# Altium footprint library mobinbyn-Module.PcbLib: 93 footprints (part 6 of 6)
Each footprint in its own frame and in the unit in brackets; x right, y up, seen from the top. Pads: shape width x height; smd on the part's side, far side on the other; paste and mask are expansions set on the pad; w line width, h text height; cw(c..) or ccw(c..) is an arc to the next point about the centre after c.
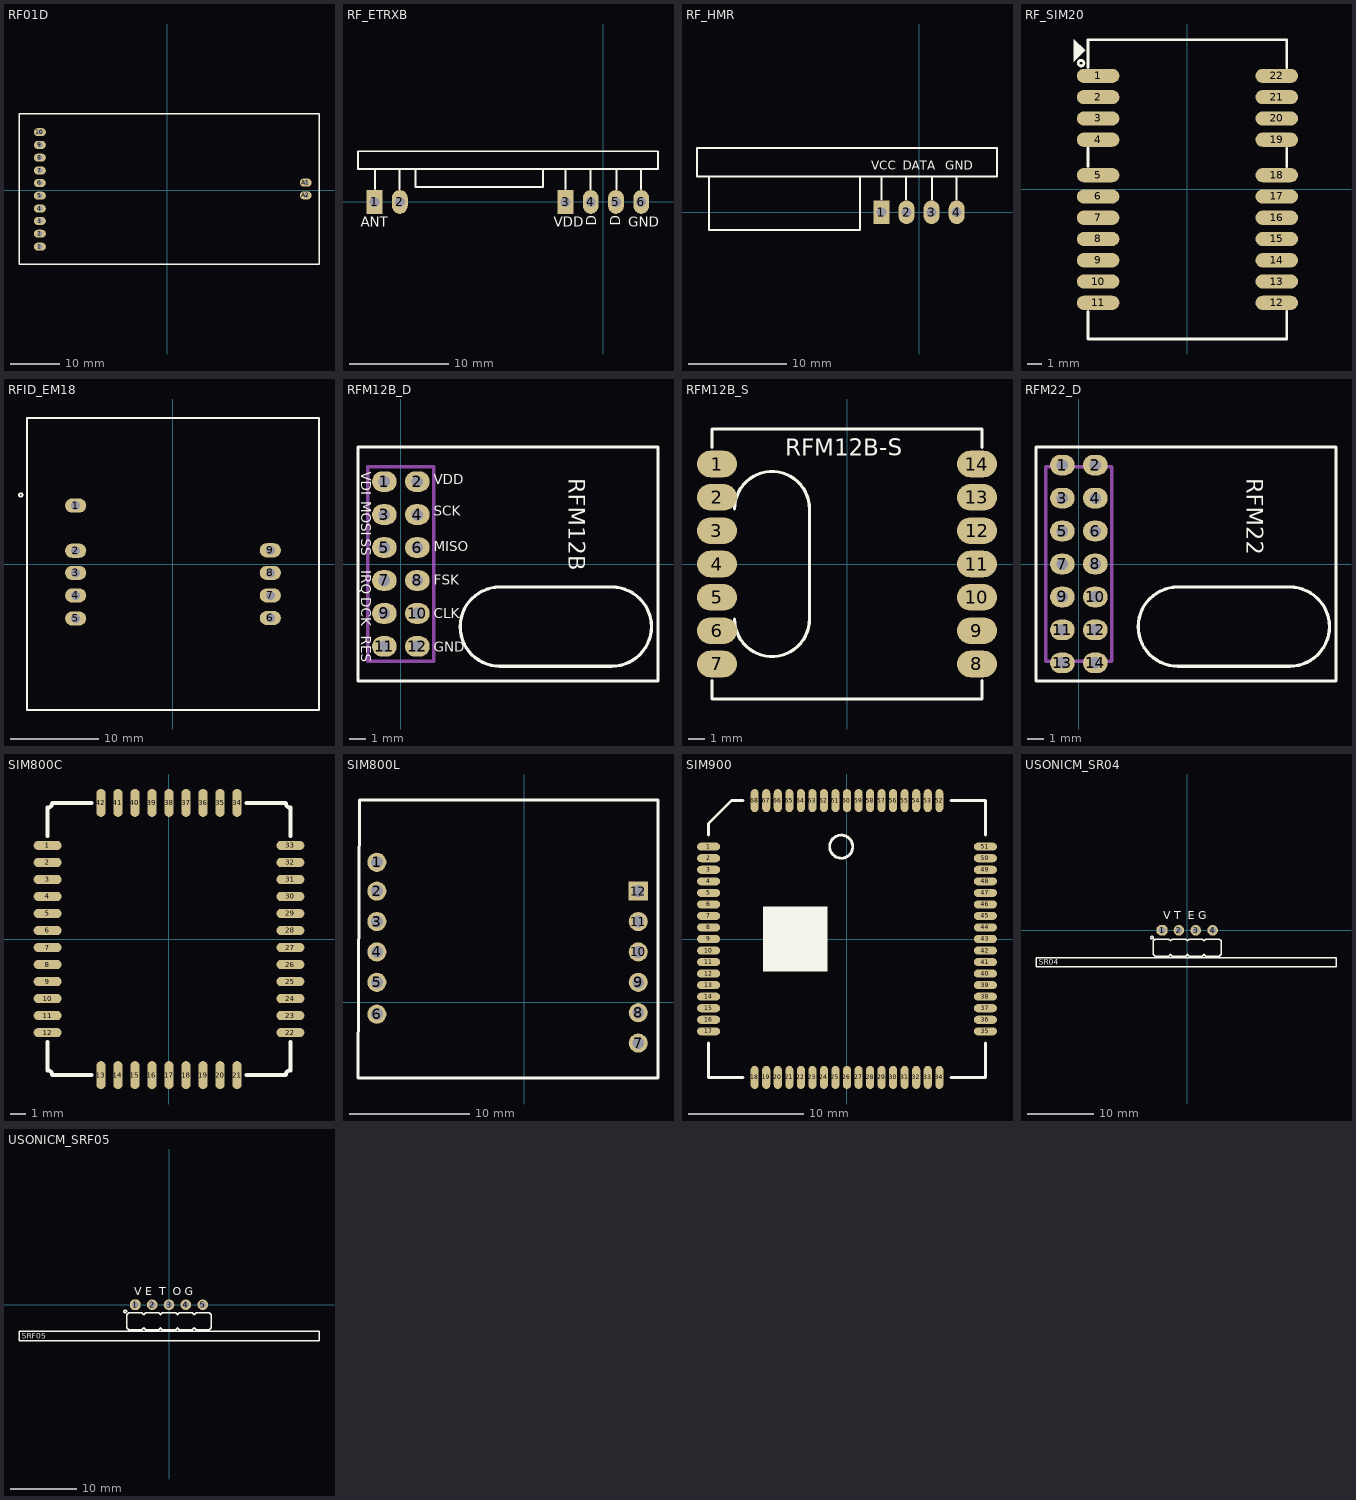
[diagram p5: the footprints below, top view; thin cyan lines are the x and y axes]

## RF01D [mm] "RF01D"
pads (12):
  oval 2.4x1.6 hole 1: 1(-25.654,-11.337) 2(-25.654,-8.737) 3(-25.654,-6.187) 4(-25.654,-3.687) 5(-25.654,-1.087) 6(-25.654,1.463) 7(-25.654,3.963) 8(-25.654,6.563) 9(-25.654,9.113) 10(-25.654,11.684) A1(27.813,1.524) A2(27.813,-1.016)
Top Overlay:
  lines w0.254: -29.845,-14.859 30.48,-14.859 30.48,15.367 -29.845,15.367 -29.845,-14.859
3D body "User Library-RF01D-1.STEP": height 12.1, standoff -9, extent -29.647,-14.746 30.353,15.254

## RF_ETRXB [mm] "Module RF, Receiver, ET-RXB-12, ET-RXB-22"
pads (6):
  rect 1.6x2.4 hole 1: 1(-23.03,0) 3(-3.81,0)
  oval 1.6x2.4 hole 1: 2(-20.49,0) 4(-1.27,0) 5(1.27,0) 6(3.81,0)
Top Overlay:
  lines w0.2: -23,1.3 -23,3.3 ; -20.5,1.3 -20.5,3.3 ; -18.9,3.3 -18.9,1.5 -6.1,1.5 -6.1,3.3 ; -3.8,1.3 -3.8,3.3 ; -1.3,1.3 -1.3,3.3 ; 1.3,1.3 1.3,3.3 ; 3.8,1.3 3.8,3.3 ; -24.7,3.3 5.5,3.3 5.5,5.1 -24.7,5.1 -24.7,3.3
  text "ANT" at -24.4,-2.5 h1
  text "GND" at 2.5,-2.5 h1
  text "D" at 1.7,-2.4 h1
  text "D" at -0.7,-2.4 h1
  text "VDD" at -5,-2.5 h1
3D body "RF_ETRXB.step": height 8.5, standoff -6.05, extent -24.6,-0.25 5.4,8.2

## RF_HMR [mm] "Module RF, Receiver, HM-R"
pads (4):
  rect 1.6x2.4 hole 1: 1(-3.81,0)
  oval 1.6x2.4 hole 1: 2(-1.27,0) 3(1.27,0) 4(3.81,0)
Top Overlay:
  lines w0.2: -21.3,3.6 -21.3,-1.8 -6,-1.8 -6,3.6 ; -3.8,1.3 -3.8,3.6 ; -1.3,1.3 -1.3,3.6 ; 1.3,1.3 1.3,3.6 ; 3.8,1.3 3.8,3.6 ; -22.5,3.6 -22.5,6.5 7.9,6.5 7.9,3.6 -22.5,3.6
  text "DATA" at -1.651,4.318 h0.89
  text "GND" at 2.667,4.318 h0.89
  text "VCC" at -4.826,4.318 h0.89
3D body "User Library-XD-RF-5V.STEP": height 14.75, standoff -4.25, extent -22.3,-1.7 7.7,6.3

## RF_SIM20 [mm] "RF MODULE, SIMCOM SIM20"
pads (22):
  oval 3x1 smd: 1(-6.3,8) 2(-6.3,6.5) 3(-6.3,5) 4(-6.3,3.5) 5(-6.3,1) 6(-6.3,-0.5) 7(-6.3,-2) 8(-6.3,-3.5) 9(-6.3,-5) 10(-6.3,-6.5) 11(-6.3,-8) 12(6.3,-8) 13(6.3,-6.5) 14(6.3,-5) 15(6.3,-3.5) 16(6.3,-2) 17(6.3,-0.5) 18(6.3,1) 19(6.3,3.5) 20(6.3,5) 21(6.3,6.5) 22(6.3,8)
Top Overlay:
  circle w0.2: c-7.5,8.9 r0.2
  region: -7.2,9.8 -8,10.6 -8,9
  lines w0.2: -7,-8.6 -7,-10.55 7,-10.55 7,-8.6 ; -7,1.6 -7,2.9 ; -7,8.6 -7,10.55 7,10.55 7,8.6 ; 7,1.6 7,2.9
3D body "SIM20.step": height 2.75, standoff 0, extent -6.9,-10.5 6.9,10.5

## RFID_EM18 [mm] "MODULE, RFID Reader, EM-18"
pads (9):
  oval 2.4x1.6 hole 1: 1(-11,6.65) 2(-11,1.55) 3(-11,-0.95) 4(-11,-3.5) 5(-11,-6.1) 6(11,-6.05) 7(11,-3.5) 8(11,-0.95) 9(11,1.6)
Top Overlay:
  circle w0.2: c-17.2,7.849 r0.2
  lines w0.2: -16.5,-16.45 -16.5,16.55 16.5,16.55 16.5,16.45 16.5,-16.45 -16.5,-16.45
3D body "User Library-EM-18.STEP": height 8.05, standoff -6.1, extent -16.5,-16.45 16.5,16.55

## RFM12B_D [mm] "MODULE, WIRELESS, RFM12B-D"
pads (12):
  oval 1.5x1.25 hole 0.7: 1(-1,5) 2(1,5) 3(-1,3) 4(1,3) 5(-1,1) 6(1,1) 7(-1,-1) 8(1,-1) 9(-1,-3) 10(1,-3) 11(-1,-5) 12(1,-5)
Top Overlay:
  lines w0.2: -2.6,-7.1 -2.6,7.1 15.6,7.1 15.6,-7.1 -2.6,-7.1 ; 6,-6.2 cw(c6,-3.8) 6,-1.4 12.8,-1.4 cw(c12.8,-3.8) 12.8,-6.2 6,-6.2
  text "VDD" at 2,4.826 h0.6
  text "SCK" at 2,2.921 h0.6
  text "MISO" at 2,0.762 h0.6
  text "FSK" at 2,-1.27 h0.6
  text "CLK" at 2,-3.302 h0.6
  text "GND" at 2,-5.334 h0.6
  text "RES" at -2.4,-4.351 h0.6
  text "DCK" at -2.4,-2.032 h0.6
  text "IRQ" at -2.4,-0.381 h0.6
  text "SS" at -2.4,1.524 h0.6
  text "MOSI" at -2.4,3.81 h0.6
  text "VDI" at -2.4,5.588 h0.6
  text "RFM12B" at 10.2,5.2 h1
Mechanical 1:
  lines w0.2: -2,-5.9 2,-5.9 2,5.9 -2,5.9 -2,-5.9
3D body "pin_header_a-sl200-dg-g06d.stp": height 9.8, standoff 1, extent -2,-5.95 2,-0.05
3D body "pin_header_a-sl200-dg-g06d.stp": height 9.8, standoff 1, extent -2,0.05 2,5.95
3D body "female_header_a-bl200-dg-g06d.stp": height 9.08, standoff 2.28, extent -2.25,-6.25 2.25,0.25
3D body "female_header_a-bl200-dg-g06d.stp": height 9.08, standoff 2.28, extent -2.25,-0.25 2.25,6.25
3D body "HC-49_LT_THT_16MHz.step": height 8.99, standoff 3.4, extent 3.725,-6.125 15.075,-1.475
3D body: height 8.2, standoff 7, extent -2.5,-7 15.5,7

## RFM12B_S [mm] "MODULE, WIRELESS, RFM12B-S"
pads (14):
  oval 2.4x1.6 smd: 1(-7.8,6) 2(-7.8,4) 3(-7.8,2) 4(-7.8,0) 5(-7.8,-2) 6(-7.8,-4) 7(-7.8,-6) 8(7.8,-6) 9(7.8,-4) 10(7.8,-2) 11(7.8,0) 12(7.8,2) 13(7.8,4) 14(7.8,6)
Top Overlay:
  lines w0.2: -8.1,-7 -8.1,-8.1 8.1,-8.1 8.1,-7 ; -8.1,7 -8.1,8.1 8.1,8.1 8.1,7 ; -6.75,-3.302 ccw(c-4.5,-3.302) -2.25,-3.302 -2.25,3.302 ccw(c-4.5,3.302) -6.75,3.302
  text "RFM12B-S" at -3.7,6.5 h1
3D body "RFM12BS.STEP": height 4.2, standoff 0.05, extent -7.96,-8.05 7.96,8.05

## RFM22_D [mm] "MODULE, WIRELESS, RFM22-D"
pads (14):
  oval 1.5x1.25 hole 0.7: 1(-1,6) 2(1,6) 3(-1,4) 4(1,4) 5(-1,2) 6(1,2) 7(-1,0) 8(1,0) 9(-1,-2) 10(1,-2) 11(-1,-4) 12(1,-4) 13(-1,-6) 14(1,-6)
Top Overlay:
  lines w0.2: -2.6,-7.1 -2.6,7.1 15.6,7.1 15.6,-7.1 -2.6,-7.1 ; 6,-6.2 cw(c6,-3.8) 6,-1.4 12.8,-1.4 cw(c12.8,-3.8) 12.8,-6.2 6,-6.2
  text "RFM22" at 10.2,5.2 h1
Mechanical 1:
  lines w0.2: -2,-5.9 2,-5.9 2,5.9 -2,5.9 -2,-5.9
3D body: height 8.2, standoff 7, extent -2.5,-7 15.5,7
3D body "pin_header_a-sl200-dg-g06d.stp": height 9.8, standoff 1, extent -2,-5.95 2,-0.05
3D body "pin_header_a-sl200-dg-g06d.stp": height 9.8, standoff 1, extent -2,0.05 2,5.95
3D body "female_header_a-bl200-dg-g06d.stp": height 4, standoff -2.8, extent -2.25,-6.25 2.25,0.25
3D body "female_header_a-bl200-dg-g06d.stp": height 4, standoff -2.8, extent -2.25,-0.25 2.25,6.25
3D body "HC-49_LT_THT_16MHz.step": height 8.99, standoff 3.4, extent 3.725,-6.125 15.075,-1.475

## SIM800C [mm]
pads (42):
  oval 1.8x0.6 smd: 1(-7.85,6.05) 2(-7.85,4.95) 3(-7.85,3.85) 4(-7.85,2.75) 5(-7.85,1.65) 6(-7.85,0.55) 7(-7.85,-0.55) 8(-7.85,-1.65) 9(-7.85,-2.75) 10(-7.85,-3.85) 11(-7.85,-4.95) 12(-7.85,-6.05) 22(7.85,-6.05) 23(7.85,-4.95) 24(7.85,-3.85) 25(7.85,-2.75) 26(7.85,-1.65) 27(7.85,-0.55) 28(7.85,0.55) 29(7.85,1.65) 30(7.85,2.75) 31(7.85,3.85) 32(7.85,4.95) 33(7.85,6.05)
  oval 0.6x1.8 smd: 13(-4.4,-8.8) 14(-3.3,-8.8) 15(-2.2,-8.8) 16(-1.1,-8.8) 17(0,-8.8) 18(1.1,-8.8) 19(2.2,-8.8) 20(3.3,-8.8) 21(4.4,-8.8) 34(4.4,8.8) 35(3.3,8.8) 36(2.2,8.8) 37(1.1,8.8) 38(0,8.8) 39(-1.1,8.8) 40(-2.2,8.8) 41(-3.3,8.8) 42(-4.4,8.8)
Top Overlay:
  lines w0.254: -7.85,-6.65 -7.85,-8.5 cw(c-7.85,-8.8) -7.55,-8.8 -5,-8.8 ; -7.85,6.65 -7.85,8.5 ccw(c-7.85,8.8) -7.55,8.8 -5,8.8 ; 5,-8.8 7.55,-8.8 cw(c7.85,-8.8) 7.85,-8.5 7.85,-6.65 ; 5,8.8 7.55,8.8 ccw(c7.85,8.8) 7.85,8.5 7.85,6.65
3D body "User Library-SIM800C-1.STEP": height 2.37, standoff 0.03, extent -7.85,-8.8 7.85,8.8

## SIM800L [mm]
pads (12):
  round 1.6 hole 1: 1(-12.319,11.684) 2(-12.319,9.271) 3(-12.319,6.731) 4(-12.319,4.191) 5(-12.319,1.651) 6(-12.319,-1.016) 7(9.525,-3.429) 8(9.525,-0.889) 9(9.525,1.651) 10(9.525,4.191) 11(9.525,6.731)
  rect 1.6x1.6 hole 1: 12(9.525,9.271)
Top Overlay:
  lines w0.254: -13.897,-6.35 11.176,-6.35 11.176,16.891 -13.76,16.891 -13.897,-6.35
3D body "User Library-module_sim800l.STEP": height 8.18, standoff -4.32, extent -13.824,-6.233 11.176,16.901

## SIM900 [mm]
height 10.95
pads (68):
  oval 2x0.7 smd: 1(-12,8) 2(-12,7) 3(-12,6) 4(-12,5) 5(-12,4) 6(-12,3) 7(-12,2) 8(-12,1) 9(-12,0) 10(-12,-1) 11(-12,-2) 12(-12,-3) 13(-12,-4) 14(-12,-5) 15(-12,-6) 16(-12,-7) 17(-12,-8) 35(12,-8) 36(12,-7) 37(12,-6) 38(12,-5) 39(12,-4) 40(12,-3) 41(12,-2) 42(12,-1) 43(12,0) 44(12,1) 45(12,2) 46(12,3) 47(12,4) 48(12,5) 49(12,6) 50(12,7) 51(12,8)
  oval 0.7x2 smd: 18(-8,-12) 19(-7,-12) 20(-6,-12) 21(-5,-12) 22(-4,-12) 23(-3,-12) 24(-2,-12) 25(-1,-12) 26(0,-12) 27(1,-12) 28(2,-12) 29(3,-12) 30(4,-12) 31(5,-12) 32(6,-12) 33(7,-12) 34(8,-12) 52(8,12) 53(7,12) 54(6,12) 55(5,12) 56(4,12) 57(3,12) 58(2,12) 59(1,12) 60(0,12) 61(-1,12) 62(-2,12) 63(-3,12) 64(-4,12) 65(-5,12) 66(-6,12) 67(-7,12) 68(-8,12)
Top Overlay:
  circle w0.254: c-0.5,8 r1
  rectangle: -7.3,-2.8 -1.7,2.8
  lines w0.254: -12,-9 -12,-12 -9,-12 ; -12,9 -12,10 -10,12 -9,12 ; 9,-12 12,-12 12,-9 ; 9,12 12,12 12,9
3D body "User Library-SIM900.STEP": height 3.02, standoff 0, extent -12,-12 12,12

## USONICM_SR04 [mm] "Ultrasonic sensor Module, HC-SR04"
pads (4):
  oct 1.6x1.6 / inner oct 1.6x1.6 / far side oct 1.6x2.2 hole 1 mask+0.1: 1(-3.81,0)
  round 1.6 / inner round 1.6 / far side oval 1.6x2.2 hole 1 mask+0.1: 2(-1.27,0) 3(1.27,0) 4(3.81,0)
Top Overlay:
  circle w0.2: c-5.33,-1.1 r0.2
  lines w0.2: -2.57,-3.6 -2.27,-3.9 -0.27,-3.9 0.03,-3.6 ; -2.57,-1.6 -2.27,-1.3 -0.27,-1.3 0.03,-1.6 ; -2.51,-3.6 -2.81,-3.9 -4.81,-3.9 -5.11,-3.6 -5.11,-1.6 -4.81,-1.3 -2.81,-1.3 -2.51,-1.6 ; -0.03,-3.6 0.27,-3.9 2.27,-3.9 2.57,-3.6 ; -0.03,-1.6 0.27,-1.3 2.27,-1.3 2.57,-1.6 ; 2.51,-3.6 2.81,-3.9 4.81,-3.9 ; 2.51,-1.6 2.81,-1.3 4.81,-1.3 ; 4.81,-3.9 5.11,-3.6 ; 4.81,-3.9 5.11,-3.6 ; 4.81,-1.3 5.11,-1.6 ; 4.81,-1.3 5.11,-1.6 ; 5.11,-3.6 5.11,-1.6 ; -22.8,-5.5 22.4,-5.5 22.4,-4.1 -22.8,-4.1 -22.8,-5.5
  text "V T  E G" at -3.63,1.7 h1.2
  text "SR04" at -22.4,-5.2 h0.8
3D body "HC-SR04_User Library.STEP": height 20.6, standoff -4.58, extent -22.7,-17.8 22.3,0.268

## USONICM_SRF05 [mm] "Ultrasonic sensor Module, SRF05"
pads (5):
  oct 1.6x1.6 / inner oct 1.6x1.6 / far side oct 1.6x2.2 hole 1 mask+0.1: 1(-5.08,0)
  round 1.6 / inner round 1.6 / far side oval 1.6x2.2 hole 1 mask+0.1: 2(-2.54,0) 3(0,0) 4(2.54,0) 5(5.08,0)
Top Overlay:
  circle w0.2: c-6.6,-1 r0.2
  lines w0.2: -3.84,-3.5 -3.54,-3.8 -1.54,-3.8 -1.24,-3.5 ; -3.84,-1.5 -3.54,-1.2 -1.54,-1.2 -1.24,-1.5 ; -3.78,-3.5 -4.08,-3.8 -6.08,-3.8 -6.38,-3.5 -6.38,-1.5 -6.08,-1.2 -4.08,-1.2 -3.78,-1.5 ; -1.3,-3.5 -1,-3.8 1,-3.8 1.3,-3.5 ; -1.3,-1.5 -1,-1.2 1,-1.2 1.3,-1.5 ; 1.24,-3.5 1.54,-3.8 3.54,-3.8 3.84,-3.5 ; 1.24,-1.5 1.54,-1.2 3.54,-1.2 3.84,-1.5 ; 3.78,-3.5 4.08,-3.8 6.08,-3.8 6.38,-3.5 6.38,-1.5 6.08,-1.2 4.08,-1.2 3.78,-1.5 ; -22.6,-5.4 22.6,-5.4 22.6,-4 -22.6,-4 -22.6,-5.4
  text "SRF05" at -22.2,-5.1 h0.8
  text "V E  T  O G" at -5.2,1.4 h1.2
3D body "HY-SRF05_v3.stp": height 20.3, standoff -6.3, extent -22.5,-17.7 22.5,0.327